# Altium footprint library TarabusLib_KAP.PcbLib: 504 footprints (part 2 of 32)
Each footprint in its own frame and in the unit in brackets; x right, y up, seen from the top. Pads: shape width x height; smd on the part's side, far side on the other; paste and mask are expansions set on the pad; w line width, h text height; cw(c..) or ccw(c..) is an arc to the next point about the centre after c.
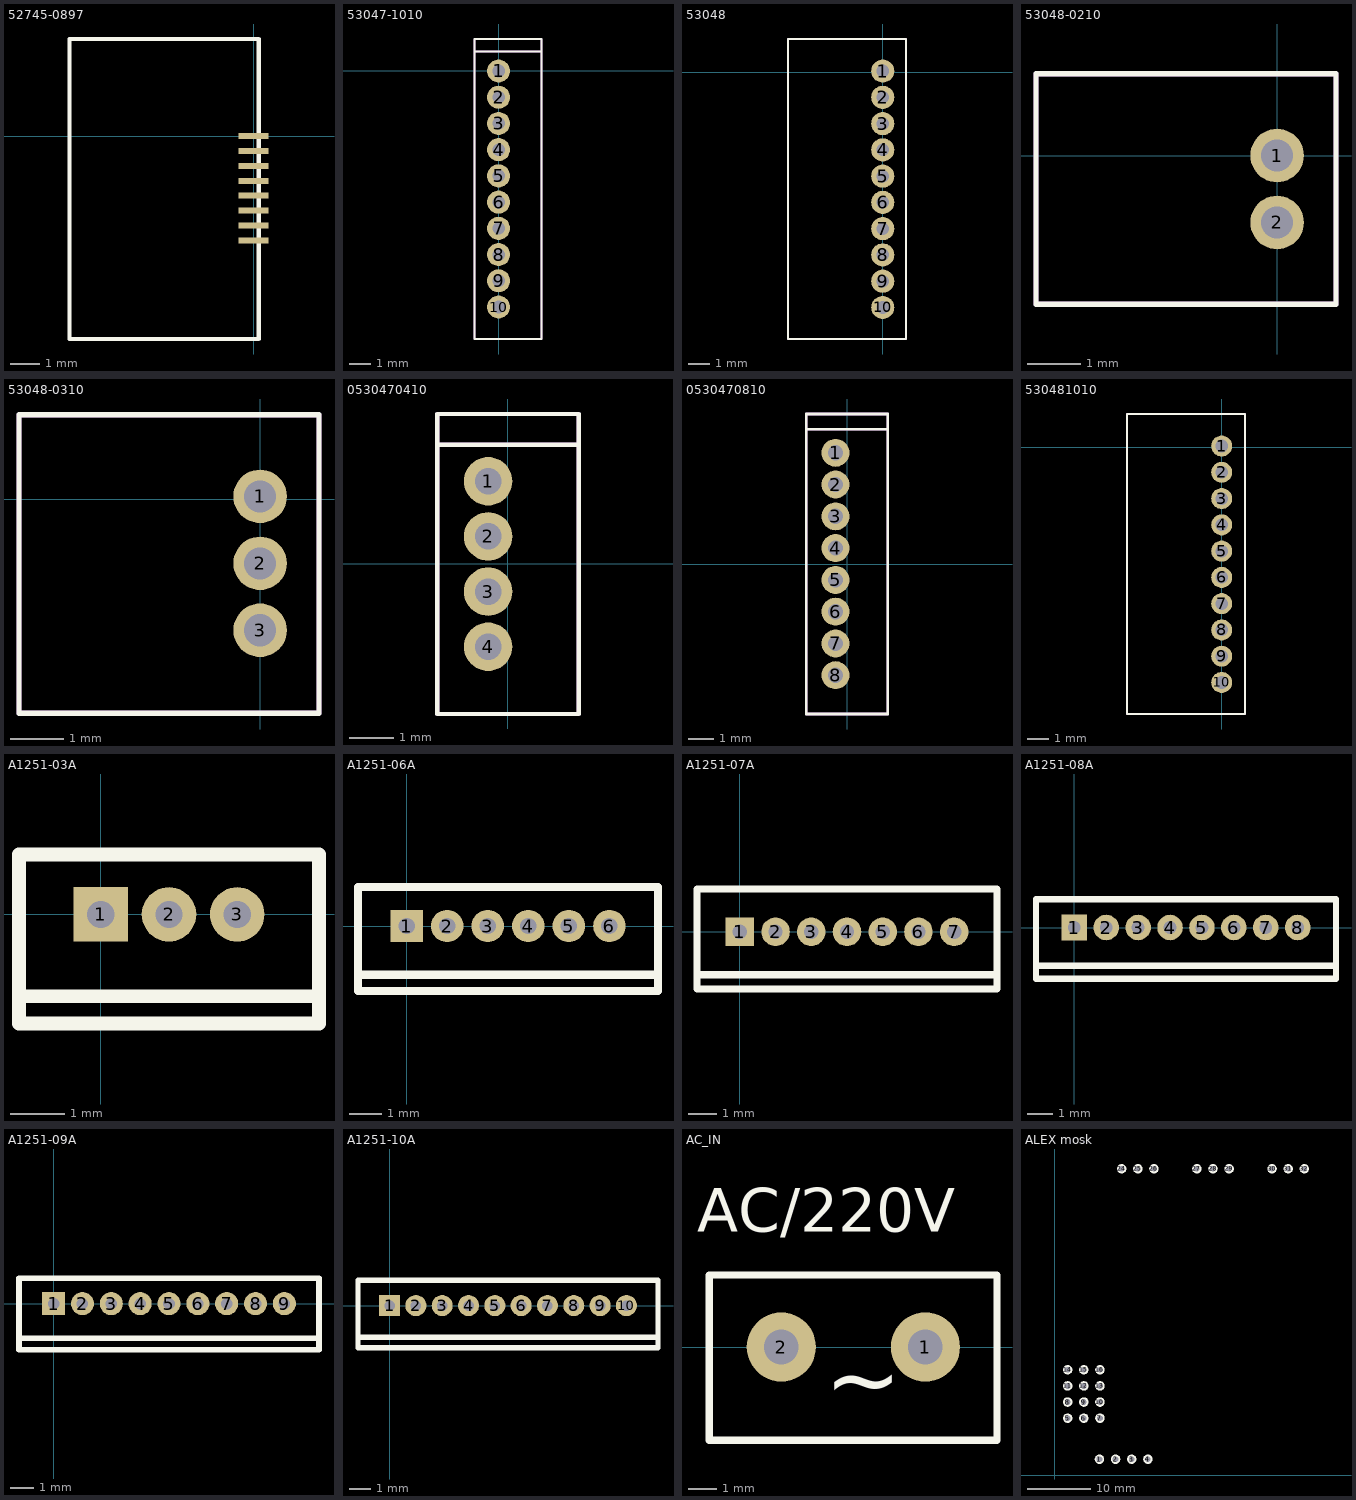
[diagram p1: the footprints below, top view; thin cyan lines are the x and y axes]

## 52745-0897 [mm]
pads (8):
  rect 1x0.2 smd mask+0: 1(0,0) 2(0,-0.5) 3(0,-1) 4(0,-1.5) 5(0,-2) 6(0,-2.5) 7(0,-3) 8(0,-3.5)
Top Overlay:
  lines w0.15: -6.18,-6.81 -6.18,3.26 0.18,3.26 0.18,-6.81 -6.18,-6.81
3D body "527450897.stp": height 2, standoff 0, extent -6.18,-6.81 0.22,3.29

## 53047-1010 [mm]
pads (10):
  round 1.1 hole 0.6 mask+0: 1(0,0) 2(0,-1.25) 3(0,-2.5) 4(0,-3.75) 5(0,-5) 6(0,-6.25) 7(0,-7.5) 8(0,-8.75) 9(0,-10) 10(0,-11.25)
Top Overlay:
  lines w0.1: -1.15,0.925 2.05,0.925 ; -1.15,-12.775 2.05,-12.775 2.05,1.525 -1.15,1.525 -1.15,-12.775
Mechanical 7:
  lines w0.1: -1.15,0.925 2.05,0.925 ; -1.15,-12.775 -1.15,1.525 2.05,1.525 2.05,-12.775 -1.15,-12.775
3D body "530471010.stp": height 4.1, standoff -2.3, extent -1.2,-12.725 2,1.525

## 53048 [mm]
pads (10):
  round 1.1 hole 0.6 mask+0: 1(0,0.05) 2(0,-1.2) 3(0,-2.45) 4(0,-3.7) 5(0,-4.95) 6(0,-6.2) 7(0,-7.45) 8(0,-8.7) 9(0,-9.95) 10(0,-11.2)
Top Overlay:
  lines w0.1: -4.5,-12.7 1.1,-12.7 1.1,1.575 -4.5,1.575 -4.5,-12.7
Mechanical 7:
  lines w0.1: -4.5,-12.7 -4.5,1.575 1.1,1.575 1.1,-12.7 -4.5,-12.7
3D body "5738.stp": height 1.75, standoff -4.05, extent -4.45,-12.625 1.05,1.625

## 53048-0210 [mm]
pads (2):
  round 1 hole 0.6 mask+0: 1(0,0) 2(0,-1.25)
Top Overlay:
  lines w0.1: -4.5,-2.775 -4.5,1.525 1.1,1.525 1.1,-2.775 -4.5,-2.775
Mechanical 7:
  lines w0.1: -4.5,-2.775 1.1,-2.775 1.1,1.525 -4.5,1.525 -4.5,-2.775
3D body "User Library-53048-0210.STEP": height 3.5, standoff -2.4, extent -4.45,-2.775 1.05,1.475

## 53048-0310 [mm]
pads (3):
  round 1 hole 0.6 mask+0: 1(0,0.05) 2(0,-1.2) 3(0,-2.45)
Top Overlay:
  lines w0.1: -4.5,-4 1.1,-4 1.1,1.575 -4.5,1.575 -4.5,-4
Mechanical 7:
  lines w0.1: -4.5,-4 -4.5,1.575 1.1,1.575 1.1,-4 -4.5,-4
3D body "5731.stp": height 3.55, standoff -2.25, extent -4.45,-3.95 1.05,1.55

## 0530470410 [mm]
pads (4):
  round 1.1 hole 0.6 mask+0: 1(-0.45,1.875) 2(-0.45,0.625) 3(-0.45,-0.625) 4(-0.45,-1.875)
Top Overlay:
  lines w0.1: -1.6,2.7 1.6,2.7 ; -1.6,-3.4 -1.6,3.4 1.6,3.4 1.6,-3.4 -1.6,-3.4
Mechanical 7:
  lines w0.1: -1.6,2.7 1.6,2.7 ; -1.6,-3.4 1.6,-3.4 1.6,3.4 -1.6,3.4 -1.6,-3.4
3D body "530470410.stp": height 4.1, standoff -2.3, extent -1.6,-3.375 1.6,3.375

## 0530470810 [mm]
pads (8):
  round 1.1 hole 0.6 mask+0: 1(-0.45,4.375) 2(-0.45,3.125) 3(-0.45,1.875) 4(-0.45,0.625) 5(-0.45,-0.625) 6(-0.45,-1.875) 7(-0.45,-3.125) 8(-0.45,-4.375)
Top Overlay:
  lines w0.1: -1.6,5.3 1.6,5.3 ; -1.6,-5.9 1.6,-5.9 1.6,5.9 -1.6,5.9 -1.6,-5.9
Mechanical 7:
  lines w0.1: -1.6,5.3 1.6,5.3 ; -1.6,-5.9 -1.6,5.9 1.6,5.9 1.6,-5.9 -1.6,-5.9
3D body "530470810.stp": height 4.1, standoff -2.3, extent -1.6,-5.875 1.6,5.875

## 530481010 [mm]
pads (10):
  round 1 hole 0.6 mask+0: 1(0,0.05) 2(0,-1.2) 3(0,-2.45) 4(0,-3.7) 5(0,-4.95) 6(0,-6.2) 7(0,-7.45) 8(0,-8.7) 9(0,-9.95) 10(0,-11.2)
Top Overlay:
  lines w0.1: -4.5,-12.7 1.1,-12.7 1.1,1.575 -4.5,1.575 -4.5,-12.7
Mechanical 7:
  lines w0.1: -4.5,-12.7 -4.5,1.575 1.1,1.575 1.1,-12.7 -4.5,-12.7
3D body "5738.stp": height 3.55, standoff -2.25, extent -4.45,-12.625 1.05,1.625

## A1251-03A [mm]
pads (3):
  rect 1x1 hole 0.5 mask+0: 1(0,0)
  round 1 hole 0.5 mask+0: 2(1.25,0) 3(2.5,0)
Top Overlay:
  lines w0.254: -1.5,-1.5 4,-1.5 ; -1.5,-2 4,-2 4,1.1 -1.5,1.1 -1.5,-2
3D body "530470310.stp": height 4.1, standoff -2.3, extent -1.5,-2.1 4,1.1

## A1251-06A [mm]
pads (6):
  rect 1x1 hole 0.5 mask+0: 1(0,0)
  round 1 hole 0.5 mask+0: 2(1.25,0) 3(2.5,0) 4(3.75,0) 5(5,0) 6(6.25,0)
Top Overlay:
  lines w0.254: -1.5,-1.5 7.75,-1.5 ; -1.5,-2 7.75,-2 7.75,1.2 -1.5,1.2 -1.5,-2
3D body "530470610.stp": height 4.1, standoff -2.3, extent -1.425,-2.1 7.825,1.1

## A1251-07A [mm]
pads (7):
  rect 1x1 hole 0.5 mask+0: 1(0,0)
  round 1 hole 0.5 mask+0: 2(1.25,0) 3(2.5,0) 4(3.75,0) 5(5,0) 6(6.25,0) 7(7.5,0)
Top Overlay:
  lines w0.254: -1.5,-1.5 9,-1.5 ; -1.5,-2 -1.5,1.5 9,1.5 9,-2 -1.5,-2
3D body: height 8, standoff 0, extent -1.5,-2 9,1.5

## A1251-08A [mm]
pads (8):
  rect 1x1 hole 0.5 mask+0: 1(0,0)
  round 1 hole 0.5 mask+0: 2(1.25,0) 3(2.5,0) 4(3.75,0) 5(5,0) 6(6.25,0) 7(7.5,0) 8(8.75,0)
Top Overlay:
  lines w0.254: -1.5,-1.5 10.2,-1.5 ; -1.5,-2 -1.5,1.1 10.25,1.1 10.25,-2 -1.5,-2
3D body "530470810.stp": height 4.1, standoff -2.3, extent -1.475,-2.1 10.275,1.1

## A1251-09A [mm]
pads (9):
  rect 1x1 hole 0.5 mask+0: 1(0,0)
  round 1 hole 0.5 mask+0: 2(1.25,0) 3(2.5,0) 4(3.75,0) 5(5,0) 6(6.25,0) 7(7.5,0) 8(8.75,0) 9(10,0)
Top Overlay:
  lines w0.254: -1.5,-1.5 11.5,-1.5 ; -1.5,-2 11.5,-2 11.5,1.1 -1.5,1.1 -1.5,-2
3D body "530470910.stp": height 4.1, standoff -2.3, extent -1.45,-2.125 11.55,1.075

## A1251-10A [mm]
pads (10):
  rect 1x1 hole 0.5 mask+0: 1(0,0)
  round 1 hole 0.5 mask+0: 2(1.25,0) 3(2.5,0) 4(3.75,0) 5(5,0) 6(6.25,0) 7(7.5,0) 8(8.75,0) 9(10,0) 10(11.25,0)
Top Overlay:
  lines w0.254: -1.5,-1.5 12.75,-1.5 ; -1.5,-2 -1.5,1.2 12.75,1.2 12.75,-2 -1.5,-2
3D body "530471010.stp": height 4.1, standoff -2.3, extent -1.525,-2 12.725,1.2

## AC_IN [mm]
pads (2):
  round 2.4 hole 1.2: 1(-7.5,0) 2(-12.5,0)
Top Overlay:
  lines w0.254: -15,-3.233 -15,2.5 -5.014,2.5 -5.014,-3.233 -15,-3.233
  text "~" at -11,-3 h4
  text "AC/220V" at -15.425,4 h1.52

## ALEX mosk [mm]
pads (25):
  round 1.5 on Top Overlay hole 0.9 unplated mask+0.1: 1(7,2.54) 2(9.54,2.54) 3(12.08,2.54) 4(14.62,2.54) 5(2,9) 6(4.54,9) 7(7.08,9) 8(2,11.54) 9(4.54,11.54) 10(7.08,11.54) 11(2,14.08) 12(4.54,14.08) 13(7.08,14.08) 14(2,16.62) 15(4.54,16.62) 16(7.08,16.62) 24(10.5,48.25) 25(13.04,48.25) 26(15.58,48.25) 27(22.33,48.25) 28(24.87,48.25) 29(27.41,48.25) 30(34.16,48.25) 31(36.7,48.25) 32(39.24,48.25)
3D body "Контроллер2.STEP": height -0.95, standoff -11.75, extent -38,-1.5 50.4,51.6